# Altium integrated library MOTHER_BOARD_LS1021_v1.0.IntLib: 147 symbols (continued)
## R0402_15
designator R?, comment 4,7 Ом  (no BOM)
Чип-резистор 4,7 Ом 5% 0402; VALUE: 10 Ом 0402; TYPE: Чип-резистор 0402
footprint R0402
pins: 1, 2

## R0402_16
designator R?, comment 200K
Чип-резистор 200 кОм 5% 0402; TYPE: Чип-резистор 0402
footprint R0402
pins: 1, 2

## R0402_17
designator R?, comment 4К99 1%
Чип-резистор 4,99 кОм 1% 0402; TYPE: Чип-резистор 0402
footprint R0402 (Р1-12-0,062)
pins: 1, 2

## R0402_18
designator R?, comment 12К1 1%
Чип-резистор 12,1 кОм 1% 0402; TYPE: Чип-резистор 0402
footprint R0402
pins: 1, 2

## R0603
designator R?, comment 499К 1%  (no BOM)
Чип-резистор 499 кОм 1% 0603; TYPE: Чип-резистор 0603
footprint R0603
footprint R0603
pins: 1, 2

## R0603_1
designator R?, comment 243К 1%
Чип-резистор 243 кОм 1% 0603; TYPE: Чип-резистор 0603
footprint R0603
footprint R0603
pins: 1, 2

## R0603_2
designator R?, comment 6К49 1%
Чип-резистор 6,49 кОм 1% 0603; TYPE: Чип-резистор 0603
footprint R0603
footprint R0603
pins: 1, 2

## R0603_3
designator R?, comment 5,1 Ом
Чип-резистор 5,1 Ом 5% 0603; TYPE: Чип-резистор 0603
footprint R0603
pins: 1, 2

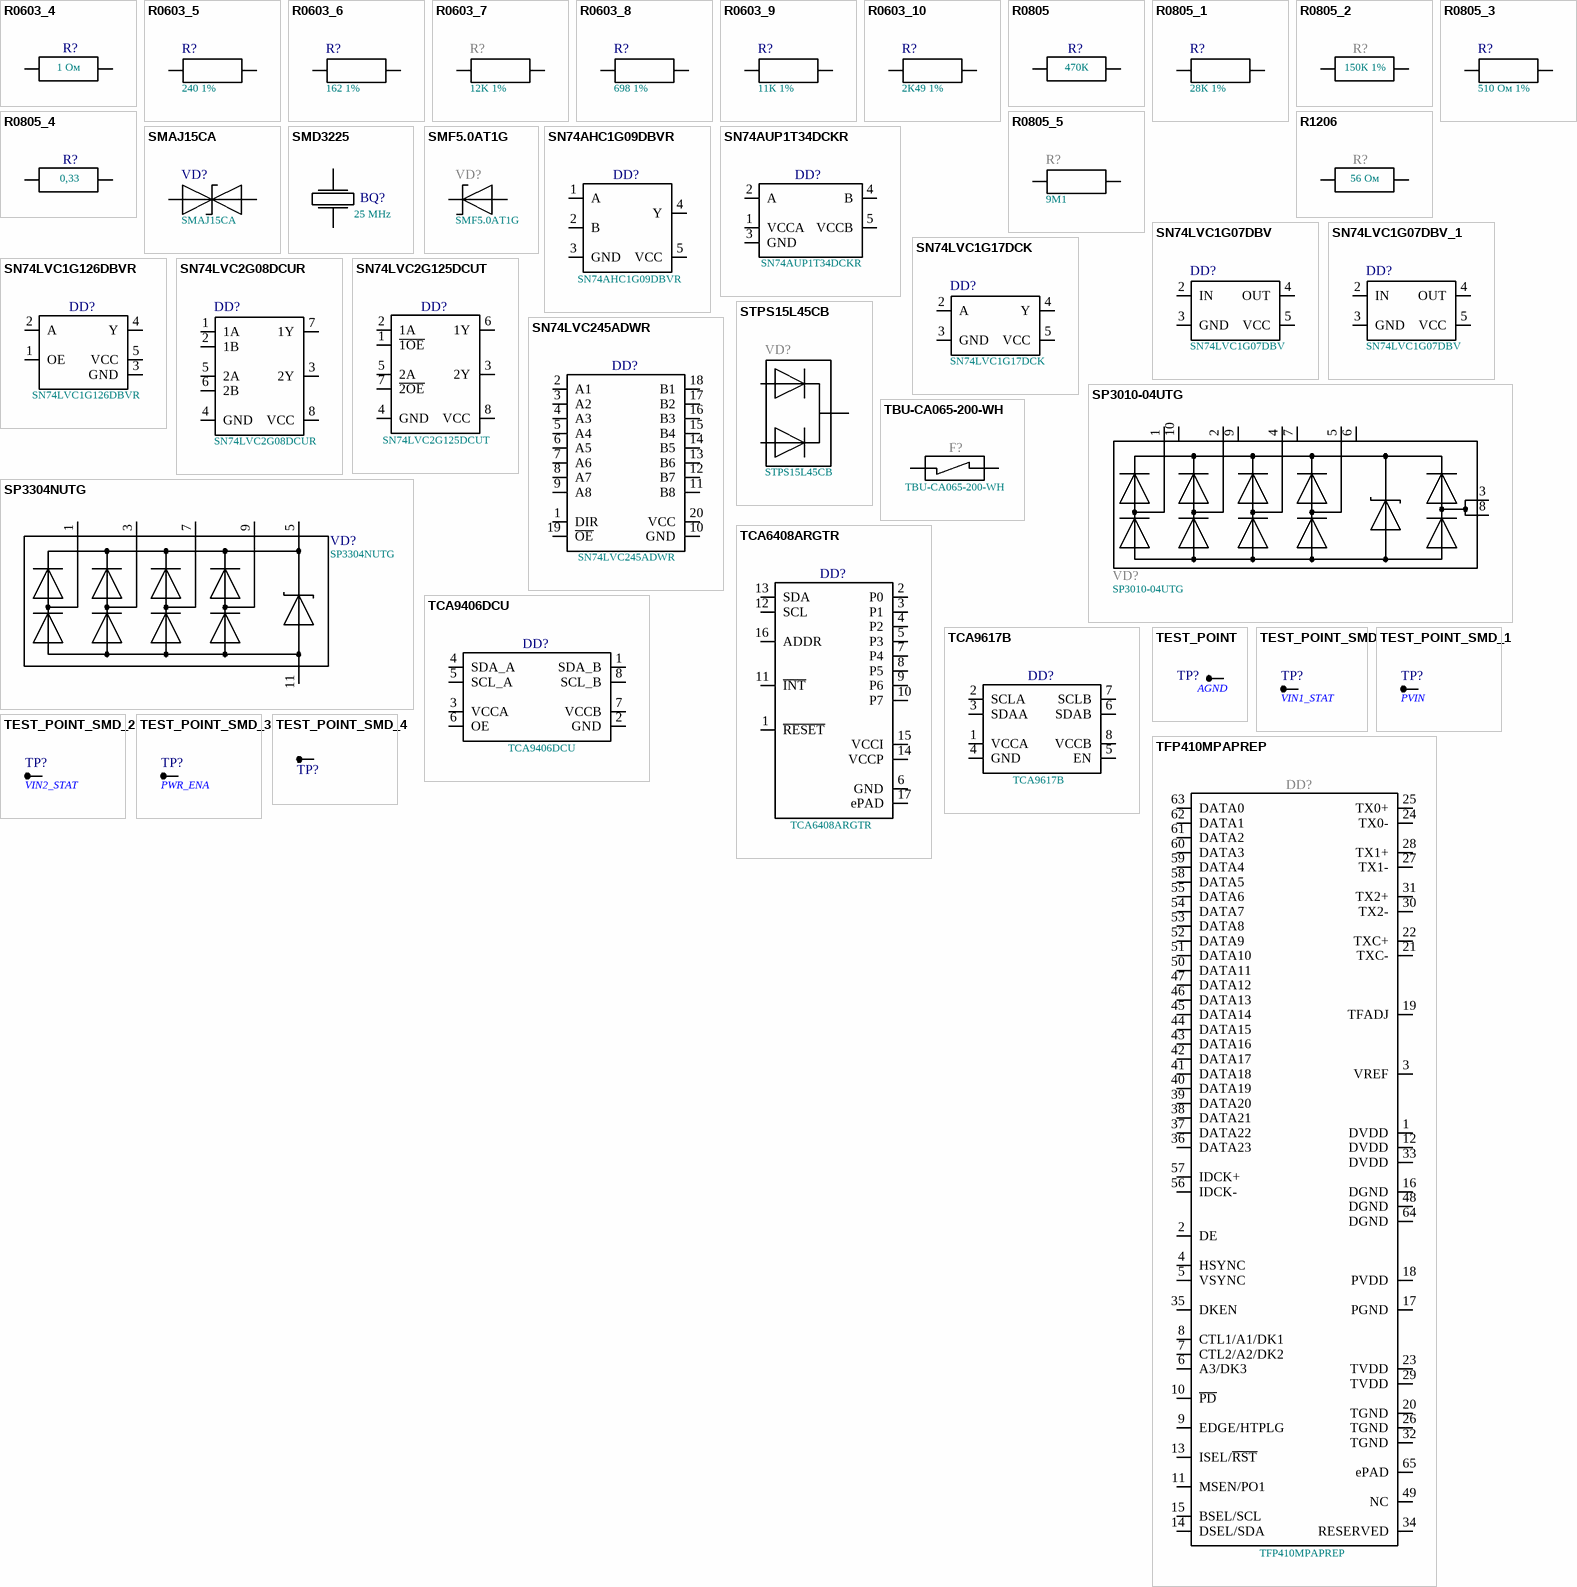
[diagram p8: symbols R0603_4 to TFP410MPAPREP]

## R0603_4
designator R?, comment 1 Ом
Чип-резистор 1 Ом 5% 0603; TYPE: Чип-резистор 0603
footprint R0603
pins: 1, 2

## R0603_5
designator R?, comment 240 1%
Чип-резистор 240 Ом 1% 0603; TYPE: Чип-резистор 0603
footprint R0603
pins: 1, 2

## R0603_6
designator R?, comment 162 1%
Чип-резистор 162 Ом 1% 0603; TYPE: Чип-резистор 0603
footprint R0603
pins: 1, 2

## R0603_7
designator R?, comment 12K 1%  (no BOM)
Чип-резистор 12 кОм 1% 0603; TYPE: Чип-резистор 0603
footprint R0603 (Р1-12-0,1)
pins: 1, 2

## R0603_8
designator R?, comment 698 1%
Чип-резистор 698 Ом 1% 0603; TYPE: Чип-резистор 0603
footprint R0603
pins: 1, 2

## R0603_9
designator R?, comment 11К 1%
Чип-резистор 11 кОм 1% 0603; TYPE: Чип-резистор 0603
footprint R0603
pins: 1, 2

## R0603_10
designator R?, comment 2К49 1%
Чип-резистор 2,49 кОм 1% 0603; TYPE: Чип-резистор 0603
footprint R0603
pins: 1, 2

## R0805
designator R?, comment 470К
Чип-резистор 470 кОм 5% 0805; TYPE: Чип-резистор 0805
footprint R0805
pins: 1, 2

## R0805_1
designator R?, comment 28К 1%
Чип-резистор 28 кОм 1% 0805; TYPE: Чип-резистор 0805
footprint R0805
pins: 1, 2

## R0805_2
designator R?, comment 150К 1%  (no BOM)
Чип-резистор 150 кОм 1%(5%) 0805; TYPE: Чип-резистор 0805
footprint R0805
pins: 1, 2

## R0805_3
designator R?, comment 510 Ом 1%
Чип-резистор 510 Ом 1% 0805; TYPE: Чип-резистор 0805
footprint R0805
pins: 1, 2

## R0805_4
designator R?, comment 0,33
Чип-резистор 0,33 Ом 1% 0805; TYPE: Чип-резистор 0805
footprint R0805
pins: 1, 2

## R0805_5
designator R?, comment 9M1  (no BOM)
Чип-резистор 9,1 МОм 5% 0805; TYPE: Чип-резистор 0805
footprint R0805
pins: 1, 2

## R1206
designator R?, comment 56 Ом  (no BOM)
Чип-резистор 56 Ом 5% 1206; TYPE: Чип-резистор 1206
footprint R1206
pins: 1, 2

## SMAJ15CA
designator VD?
Диод TVS симметричный SMAJ15CA SMA (DO-214AC)
footprint SMA(DO-214AC)
pins: 1, 2

## SMD3225
designator BQ?, comment 25 MHz
Резонатор кварцевый DSX321G 25 MHz; TYPE: SMD3225 24.000 MHz; VALUE: 25 MHz
footprint SMD0302
pins: 1, 2 hidden, 3, 4 hidden

## SMF5.0AT1G
designator VD?  (no BOM)
Диод TVS SMF5.0AT1G SOD-123
footprint SOD-123
pins: 1, 2

## SN74AHC1G09DBVR
designator DD?
Микросхема SN74AHC1G09DBVR; Manufactory: Texas instruments; Function: Single 2–Input Positive-AND Gate With Open-Drain Output
footprint SOT-23(DBV5)
pins: 1 A, 2 B, 3 GND, 4 Y, 5 VCC

## SN74AUP1T34DCKR
designator DD?
Микросхема SN74AUP1T34DCKR; Manufactory: Texas Instruments; Function: 1-Bit Unidirectional Voltage-Level Translator
footprint SC70
pins: 1 VCCA, 2 A, 3 GND, 4 B, 5 VCCB

## SN74LVC1G07DBV
designator DD?
Микросхема SN74LVC1G07DBV; Manufactory: Texas Instruments; ExtendedDescription: Буфер логический OD; Function: Single Buffer/Driver With Open-Drain Output; VALUE: SN74LVC1G07DBV
footprint SOT-23(DBV5)
pins: 2 IN, 3 GND, 4 OUT, 5 VCC

## SN74LVC1G07DBV_1
designator DD?, comment SN74LVC1G07DBV
Микросхема SN74LVC1G07DBV; Manufactory: Texas Instruments; Function: Single Buffer/Driver With Open-Drain Output
footprint SOT-23(DBV5)
pins: 2 IN, 3 GND, 4 OUT, 5 VCC

## SN74LVC1G17DCK
designator DD?
Микросхема SN74LVC1G17DCK; Manufactory: Texas Instruments; Function: Single Schmitt-Trigger Buffer
footprint SC70
pins: 2 A, 3 GND, 4 Y, 5 VCC

## SN74LVC1G126DBVR
designator DD?
Микросхема SN74LVC1G126DBVR; Manufactory: Texas Instruments; Function: Single Bus Buffer Gate With 3-State Outputs
footprint SOT-23(DBV5)
pins: 1 OE, 2 A, 3 GND, 4 Y, 5 VCC

## SN74LVC2G08DCUR
designator DD?
Микросхема SN74LVC2G08DCUR; Manufactory: Texas Instruments; Function: Dual 2-Input Positive-AND Gate
footprint VSSOP8
pins: 1 1A, 2 1B, 3 2Y, 4 GND, 5 2A, 6 2B, 7 1Y, 8 VCC

## SN74LVC2G125DCUT
designator DD?
Микросхема SN74LVC2G125DCUT; Manufactory: Texas Instruments; Function: Dual Bus Buffer Gate With 3-State Outputs
footprint VSSOP8
pins: 1 ~{1OE}, 2 1A, 3 2Y, 4 GND, 5 2A, 6 1Y, 7 ~{2OE}, 8 VCC

## SN74LVC245ADWR
designator DD?
Микросхема SN74LVC245ADWR; Manufactory: Texas Instruments; Function: Octal Bus Transceiver With 3-State Outputs
footprint SOIC-20(WIDE)
pins: 1 DIR, 2 A1, 3 A2, 4 A3, 5 A4, 6 A5, 7 A6, 8 A7, 9 A8, 10 GND, 11 B8, 12 B7, 13 B6, 14 B5, 15 B4, 16 B3, 17 B2, 18 B1, 19 ~{OE}, 20 VCC

## SP3010-04UTG
designator VD?  (no BOM)
Сборка диодная TVS SP3010-04UTG
footprint uDFN10
pins: 1, 2, 3, 4, 5, 6, 7, 8, 9, 10

## SP3304NUTG
designator VD?
Диодная сброка ESD защиты SP3304NUTG uDFN-10 Littelfuse
footprint DFN10
pins: 1, 3, 5, 7, 9, 11

## STPS15L45CB
designator VD?  (no BOM)
Диодная сборка с общим катодом STPS15L45CB DPAK
footprint DPAK
pins: 1 A1, 2 A2, 3 K

## TBU-CA065-200-WH
designator F?  (no BOM)
Токовый ограничитель TBU-CA065-200-WH Bourns; VALUE: TBU-CA065-200-WH
footprint TBU-CA065-200-WH
pins: 1, 3

## TCA6408ARGTR
designator DD?
Микросхема TCA6408ARGTR; Manufactory: Texas Instruments; Function: 8-Bit I2C I/O Expander
footprint VQFN-16 (tca6408argtr)
pins: 1 ~{RESET}, 2 P0, 3 P1, 4 P2, 5 P3, 6 GND, 7 P4, 8 P5, 9 P6, 10 P7, 11 ~{INT}, 12 SCL, 13 SDA, 14 VCCP, 15 VCCI, 16 ADDR, 17 ePAD

## TCA9406DCU
designator DD?
Микросхема TCA9406DCU; Manufactory: Texas Instruments; Function: 2-Bit Bidirectional 1-MHz I2C Bus and SMBus Voltage-Level Shifter
footprint VSSOP8
pins: 1 SDA_B, 2 GND, 3 VCCA, 4 SDA_A, 5 SCL_A, 6 OE, 7 VCCB, 8 SCL_B

## TCA9617B
designator DD?
Level-Translating FM+ I2C Bus Repeater TCA9617BDGKR
footprint VSSOP8
pins: 1 VCCA, 2 SCLA, 3 SDAA, 4 GND, 5 EN, 6 SDAB, 7 SCLB, 8 VCCB

## TEST_POINT
designator TP?, comment AGND  (no BOM)
Контрольная точка DIP
footprint KONT_04/09
pins: 1

## TEST_POINT_SMD
designator TP?, comment VIN1_STAT  (no BOM)
Контрольная точка SMD
footprint TEST_POINT_SMD
pins: 1

## TEST_POINT_SMD_1
designator TP?, comment PVIN  (no BOM)
Контрольная точка SMD
footprint TEST_POINT_SMD
pins: 1

## TEST_POINT_SMD_2
designator TP?, comment VIN2_STAT  (no BOM)
Контрольная точка SMD
footprint TEST_POINT_SMD
pins: 1

## TEST_POINT_SMD_3
designator TP?, comment PWR_ENA  (no BOM)
Контрольная точка SMD
footprint TEST_POINT_SMD
pins: 1

## TEST_POINT_SMD_4
designator TP?, comment TEST_POINT_SMD  (value not drawn)  (no BOM)
Контрольная точка SMD
footprint TEST_POINT_SMD
pins: 1

## TFP410MPAPREP
designator DD?  (no BOM)
Микросхема TFP410MPAPREP; Manufactory: Texas Instruments; Function: DVI transmitter/serializer
footprint LQFP64 0.3x1.3 P0.5 Thermal PAD (TFP410MPAPREP)
pins: 1 DVDD, 2 DE, 3 VREF, 4 HSYNC, 5 VSYNC, 6 A3/DK3, 7 CTL2/A2/DK2, 8 CTL1/A1/DK1, 9 EDGE/HTPLG, 10 ~{PD}, 11 MSEN/PO1, 12 DVDD, 13 ISEL/~{RST}, 14 DSEL/SDA, 15 BSEL/SCL, 16 DGND, 17 PGND, 18 PVDD, 19 TFADJ, 20 TGND, 21 TXC-, 22 TXC+, 23 TVDD, 24 TX0-, 25 TX0+, 26 TGND, 27 TX1-, 28 TX1+, 29 TVDD, 30 TX2-, 31 TX2+, 32 TGND, 33 DVDD, 34 RESERVED, 35 DKEN, 36 DATA23, 37 DATA22, 38 DATA21, 39 DATA20, 40 DATA19, 41 DATA18, 42 DATA17, 43 DATA16, 44 DATA15, 45 DATA14, 46 DATA13, 47 DATA12, 48 DGND, 49 NC, 50 DATA11, 51 DATA10, 52 DATA9, 53 DATA8, 54 DATA7, 55 DATA6, 56 IDCK-, 57 IDCK+, 58 DATA5, 59 DATA4, 60 DATA3, 61 DATA2, 62 DATA1, 63 DATA0, 64 DGND, 65 ePAD

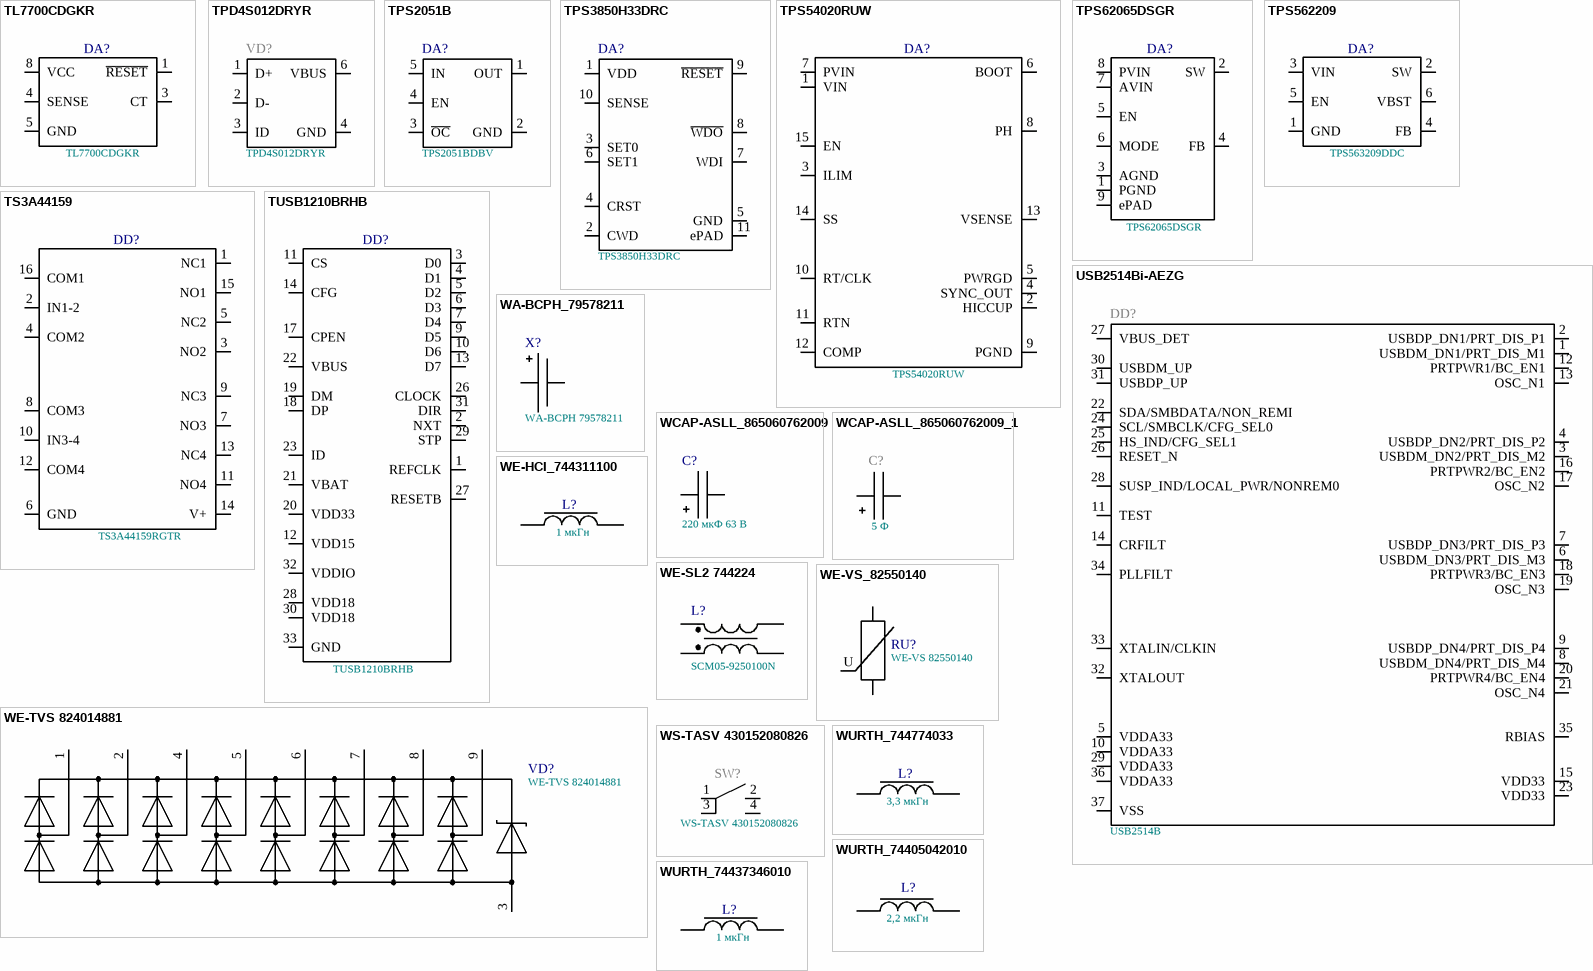
[diagram p9: symbols TL7700CDGKR to WURTH_74437346010]

## TL7700CDGKR
designator DA?
Микросхема TL7700CDGKR; Manufactory: Texas Instruments; Function: Supply-Voltage Supervisor
footprint VSSOP8 P0.65 (TCA9617B)
pins: 1 ~{RESET}, 3 CT, 4 SENSE, 5 GND, 8 VCC

## TPD4S012DRYR
designator VD?  (no BOM)
Диодная сборка защитная интерфейса USB TPD4S012DRYR SON-6 TI; VALUE: TPD4S012DRYR
footprint SON-6 (LSF0101DRYR)
pins: 1 D+, 2 D-, 3 ID, 4 GND, 6 VBUS

## TPS2051B
designator DA?, comment TPS2051BDBV
Микросхема TPS2051BDBV; Manufactory: Texas Instruments; Function: Ключ с токовым ограничением
footprint SOT-23(DBV5)
pins: 1 OUT, 2 GND, 3 ~{OC}, 4 EN, 5 IN

## TPS3850H33DRC
designator DA?
Микросхема TPS3850H33DRC; Manufactory: Texas Instruments; Function: Precision Voltage Supervisor with Programmable Window Watchdog Timer
footprint VSON-10 (TPS3850)
pins: 1 VDD, 2 CWD, 3 SET0, 4 CRST, 5 GND, 6 SET1, 7 WDI, 8 ~{WDO}, 9 ~{RESET}, 10 SENSE, 11 ePAD

## TPS54020RUW
designator DA?
Микросхема TPS54020RUW; Manufactory: Texas Instruments; Function: 4.5V to 17V Input 10A Synchronous Step-Down SWIFT™ Converter
footprint PVQFN-N15
pins: 1 VIN (power), 2 HICCUP (power), 3 ILIM (power), 4 SYNC_OUT (power), 5 PWRGD (power), 6 BOOT (power), 7 PVIN (power), 8 PH (power), 9 PGND (power), 10 RT/CLK (power), 11 RTN (power), 12 COMP (power), 13 VSENSE (power), 14 SS (power), 15 EN (power)

## TPS62065DSGR
designator DA?
Микросхема TPS62065DSGR; Manufactory: Texas Instruments; Function: 2-A Step-Down DC/DC Converter
pins: 1 PGND, 2 SW, 3 AGND, 4 FB, 5 EN, 6 MODE, 7 AVIN, 8 PVIN, 9 ePAD

## TPS562209
designator DA?, comment TPS563209DDC
Микросхема TPS563209DDC; Manufactory: Texas Instruments; Function: 4.5V to 17 V Input 3-A Synchronous Step-Down Voltage Regulator
footprint SOT23-6 (SOT23, 6-Leads, Body 2,90x2,70mm, Pitch 0,95mm, IPC Medium Density)
pins: 1 GND, 2 SW, 3 VIN, 4 FB, 5 EN, 6 VBST

## TS3A44159
designator DD?, comment TS3A44159RGTR
Микросхема TS3A44159RGTR; Manufactory: Texas Instruments; Function: 4-channel 2:1 analog switch with low on-state resistance (0.45 Ω)
footprint PVQFN16
pins: 1 NC1, 2 IN1-2, 3 NO2, 4 COM2, 5 NC2, 6 GND, 7 NO3, 8 COM3, 9 NC3, 10 IN3-4, 11 NO4, 12 COM4, 13 NC4, 14 V+, 15 NO1, 16 COM1

## TUSB1210BRHB
designator DD?
Микросхема TUSB1210BRHB; Manufactory: Texas Instruments; Function: High-speed 480-Mbps USB 2.0 OTG transceiver
footprint PVQFN-N32 (PQFN, 32-Leads, Body 5,00x5,00mm, Pitch 0,50mm, Thermal Pad 3,45x3,45mm, IPC Medium Density)
pins: 1 REFCLK, 2 NXT, 3 D0, 4 D1, 5 D2, 6 D3, 7 D4, 9 D5, 10 D6, 11 CS, 12 VDD15, 13 D7, 14 CFG, 17 CPEN, 18 DP, 19 DM, 20 VDD33, 21 VBAT, 22 VBUS, 23 ID, 26 CLOCK, 27 RESETB, 28 VDD18, 29 STP, 30 VDD18, 31 DIR, 32 VDDIO, 33 GND

## USB2514Bi-AEZG
designator DD?, comment USB2514B  (no BOM)
Микросхема USB2514Bi-AEZG; Manufactory: Texas Instruments; Function: USB 2.0 Hi-Speed Hub Controller
footprint QFN36_PAD
pins: 1 USBDM_DN1/PRT_DIS_M1, 2 USBDP_DN1/PRT_DIS_P1, 3 USBDM_DN2/PRT_DIS_M2, 4 USBDP_DN2/PRT_DIS_P2, 5 VDDA33, 6 USBDM_DN3/PRT_DIS_M3, 7 USBDP_DN3/PRT_DIS_P3, 8 USBDM_DN4/PRT_DIS_M4, 9 USBDP_DN4/PRT_DIS_P4, 10 VDDA33, 11 TEST, 12 PRTPWR1/BC_EN1, 13 OSC_N1, 14 CRFILT, 15 VDD33, 16 PRTPWR2/BC_EN2, 17 OSC_N2, 18 PRTPWR3/BC_EN3, 19 OSC_N3, 20 PRTPWR4/BC_EN4, 21 OSC_N4, 22 SDA/SMBDATA/NON_REMI, 23 VDD33, 24 SCL/SMBCLK/CFG_SEL0, 25 HS_IND/CFG_SEL1, 26 RESET_N, 27 VBUS_DET, 28 SUSP_IND/LOCAL_PWR/NONREM0, 29 VDDA33, 30 USBDM_UP, 31 USBDP_UP, 32 XTALOUT, 33 XTALIN/CLKIN, 34 PLLFILT, 35 RBIAS, 36 VDDA33, 37 VSS

## WA-BCPH_79578211
designator X?, comment WA-BCPH 79578211
Держатель элемента 2450 WA-BCPH 79578211 Wurth Elektronik
footprint WE 79578211 (Battery Holder)
pins: 1, 2

## WCAP-ASLL_865060762009
designator C?, comment 220 мкФ 63 В
Чип-конденсатор электролитический WCAP-ASLL 865060762009 220 мкФ 63 В Wurth Elektronik
footprint WCAP-ASLL_12.5x14 (Aluminium Electrolytic V-Chip SMT Capacitors, §¶12.5x14mm)
pins: 1, 2

## WCAP-ASLL_865060762009_1
designator C?, comment 5 Ф  (no BOM)
Ионистор WEC6R0505QG
footprint WCAP-ASLL_12.5x14 (Aluminium Electrolytic V-Chip SMT Capacitors, §¶12.5x14mm)
pins: 1, 2

## WE-HCI_744311100
designator L?, comment 1 мкГн
Индуктивность SP17-0700401R0M (аналог WE-HCI 744311100 1 мкГн 15 А Wurth Elektronik)
footprint WE-HCI_7040 (SMT Flat Wire High Current Inductor, body 6.9x6.9mm)
pins: 1, 2

## WE-SL2 744224
designator L?, comment SCM05-9250100N
Фильтр частотный SCM05-9250100N (аналог WE-SL2 744226)
footprint WE-SL2 (SMD Common Mode Line Filter)
pins: 1, 2, 3, 4

## WE-TVS 824014881
designator VD?
Диодная сброка ESD защиты WE-TVS 824014881 Wurth Elektronik
footprint DFN3810-9L (WE 824014881)
pins: 1, 2, 3, 4, 5, 6, 7, 8, 9

## WE-VS_82550140
designator RU?, comment WE-VS 82550140
Варистор WE-VS 82550140 Wurth Elektronik
footprint WE-VS_0805 (SMD Varistor, 2-Leads, body 2x1.25mm)
pins: 1, 2
text: U

## WS-TASV 430152080826
designator SW?  (no BOM)
Кнопка тактовая SMD WS-TASV 430152080826
footprint WE 430152080826 (SMD Tact Switch, body 6x6mm)
pins: 1, 2, 3, 4

## WURTH_744774033
designator L?, comment 3,3 мкГн
Дроссель SP03-0605A3R3M 3,3 мкГн 4 А (аналог 744774033  Wurth Elektronik); TYPE: Дроссель SDR0403
footprint WURTH_744774033
pins: 1, 2

## WURTH_74405042010
designator L?, comment 2,2 мкГн
Индуктивность SP07-0400202R2M 2,2 мкГн 4,3 А CHIKARA
footprint WURTH-LQSH-4020 (74405042022, 74405042010)
pins: 1, 2

## WURTH_74437346010
designator L?, comment 1 мкГн
Индуктивность SP14-0700301R0M03 (аналог 74437346010 1 мкГн 8 А Wurth Elektronik); TYPE: Дроссель SDR0403
footprint WURTH_74437346010
pins: 1, 2